# Altium footprint library klp.PcbLib: 436 footprints (part 23 of 28)
Each footprint in its own frame and in the unit in brackets; x right, y up, seen from the top. Pads: shape width x height; smd on the part's side, far side on the other; paste and mask are expansions set on the pad; w line width, h text height; cw(c..) or ccw(c..) is an arc to the next point about the centre after c.
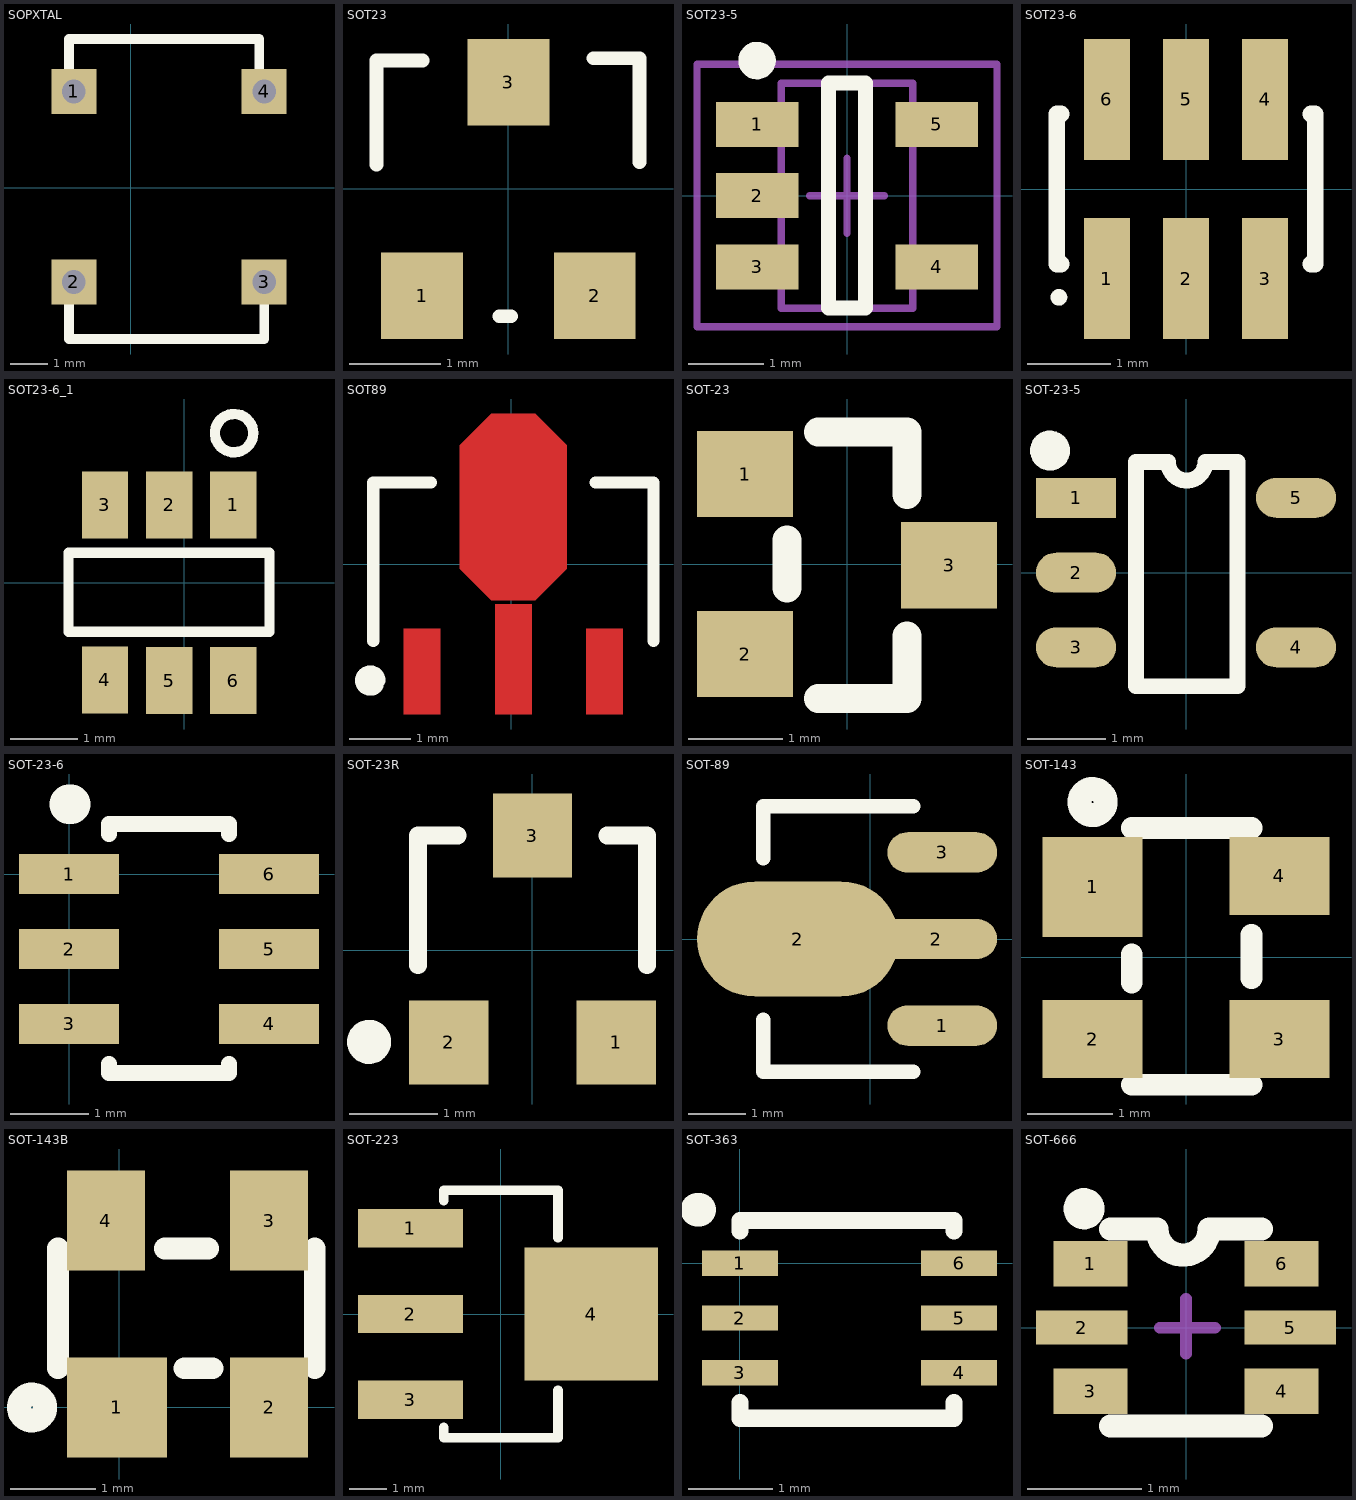
[diagram p22: the footprints below, top view; thin cyan lines are the x and y axes]

## SOPXTAL [mm]
height 1
pads (4):
  rect 1.2x1.2 on Top hole 0.635: 1(-1.524,2.565) 2(-1.524,-2.515) 3(3.556,-2.515) 4(3.556,2.565)
Top Overlay:
  lines w0.254: -1.651,-2.515 -1.651,-4.039 3.556,-4.039 3.556,-2.515 ; -1.651,2.565 -1.651,3.962 3.429,3.962 3.429,2.565

## SOT23 [mm]
pads (3):
  rect 0.9x0.95 smd: 1(-0.95,-1.175) 2(0.95,-1.175) 3(0,1.175)
Top Overlay:
  lines w0.152: -1.453,0.27 -1.453,1.413 -0.945,1.413 ; -0.1,-1.4 0.027,-1.4 ; 0.936,1.439 1.444,1.439 1.444,0.296
3D body "User Library-SOT23-3.STEP": height 1.3, standoff 0, extent -1.45,-1.4 1.45,1.4

## SOT23-5 [mm] "SOT23-5"
pads (5):
  rect 1.1x0.6 smd: 1(-1.2,0.95) 2(-1.2,0) 3(-1.2,-0.95) 4(1.2,-0.95) 5(1.2,0.95)
Top Overlay:
  circle w0.25: c-1.2,1.8 r0.125
  lines w0.2: -0.25,-1.5 0.25,-1.5 0.25,1.5 -0.25,1.5 -0.25,-1.5
Mechanical 13:
  lines w0.1: -0.875,-1.5 -0.875,1.5 0.875,1.5 0.875,-1.5 -0.875,-1.5
Mechanical 15:
  lines w0.1: -0.5,0 0.5,0 ; 0,-0.5 0,0.5 ; -2,-1.75 -2,1.75 2,1.75 2,-1.75 -2,-1.75
3D body "User Library-SOT23-5-2.step": height 1.45, standoff 0, extent -1.4,-1.45 1.4,1.45

## SOT23-6 [mm] "SOT-23/SC-74A; 5 Leads; Body 3.1 x 3 mm, inc. leads (LxW max)"
height 1.45
pads (6):
  rect 0.55x1.45 smd: 1(-0.95,-1.075) 2(0,-1.075) 3(0.95,-1.075) 4(0.95,1.075) 5(0,1.075) 6(-0.95,1.075)
Top Overlay:
  circle w0.1: c-1.525,-1.3 r0.05
  lines w0.2: -1.5,-0.9 -1.55,-0.9 -1.55,0.9 -1.5,0.9 ; 1.5,-0.9 1.55,-0.9 1.55,0.9 1.5,0.9

## SOT23-6_1 [mil]
pads (6):
  rect 27x39 smd: 1(28.63,45.47) 2(-8.78,45.47) 3(-46.18,45.47) 4(-46.18,-56.5) 5(-8.78,-56.89) 6(28.63,-56.89)
Top Overlay:
  circle w6: c29.02,87.2 r11.15
  lines w6: -67.37,-28.53 -67.37,17.47 49.63,17.47 49.63,-28.53 -67.37,-28.53
3D body "User Library-SOT23-6-2.step": height 57.09, standoff 0, extent -65.94,-61.02 48.23,49.21

## SOT89 [mm]
pads (4):
  round 0 smd: 1(-1.463,-1.764) 2(0.038,-1.564) 3(1.538,-1.764) 4(0.038,0.936)
Top Layer:
  region: -0.84,-0.077 -0.326,-0.592 0.401,-0.592 0.915,-0.077 0.915,1.95 0.401,2.464 -0.326,2.464 -0.84,1.95
  region: 1.838,-2.464 1.237,-2.464 1.237,-1.064 1.838,-1.064
  region: 0.338,-2.464 -0.262,-2.464 -0.262,-0.664 0.338,-0.664
  region: -1.162,-2.464 -1.763,-2.464 -1.763,-1.064 -1.162,-1.064
Top Overlay:
  lines w0.2: -2.262,-1.264 -2.262,1.336 -1.312,1.336 ; 1.388,1.336 2.337,1.336 2.337,-1.264
  lines w0.25: -2.218,-1.996 cw(c-2.312,-1.914) -2.188,-1.914
Top Paste:
  region: -0.84,-0.077 -0.326,-0.592 0.401,-0.592 0.915,-0.077 0.915,1.95 0.401,2.464 -0.326,2.464 -0.84,1.95
  region: 1.838,-2.464 1.237,-2.464 1.237,-1.064 1.838,-1.064
  region: 0.338,-2.464 -0.262,-2.464 -0.262,-0.664 0.338,-0.664
  region: -1.162,-2.464 -1.763,-2.464 -1.763,-1.064 -1.162,-1.064
Top Solder:
  region: -0.84,-0.077 -0.326,-0.592 0.401,-0.592 0.915,-0.077 0.915,1.95 0.401,2.464 -0.326,2.464 -0.84,1.95
  region: 1.838,-2.464 1.237,-2.464 1.237,-1.064 1.838,-1.064
  region: 0.338,-2.464 -0.262,-2.464 -0.262,-0.664 0.338,-0.664
  region: -1.162,-2.464 -1.763,-2.464 -1.763,-1.064 -1.162,-1.064

## SOT-23 [mil]
pads (3):
  rect 40x36 smd: 1(-42.5,37.5) 2(-42.5,-37.5) 3(42.5,-0.5)
Top Overlay:
  lines w12: -25,-10 -25,10 ; -12,-56 25,-56 25,-30 ; -12,55 25,55 25,29
3D body "sot23-3.STEP": height 39.37, standoff -0.79, extent -47,-57.48 50.48,57.48

## SOT-23-5 [mil]
pads (5):
  rect 40x20 smd: 1(-55,37.4)
  oval 40x20 smd: 2(-55,0) 3(-55,-37.4) 4(55,-37.4) 5(55,37.4)
Top Overlay:
  circle w10: c-68,61 r5
  lines w7.87: -25,55.4 -25,-56.8 25.7,-56.8 25.7,55.4 ; -9,55.4 ccw(c0.35,55.4) 9.7,55.4
  lines w8: -25,55.4 -9,55.4 ; 9.7,55.4 25.7,55.4
3D body "User Library-SOT23-5.STEP": height 42.79, standoff -0.51, extent -55.16,-57.06 55.09,57.09

## SOT-23-6 [mil]
pads (6):
  rect 50x20 smd: 1(0,0) 2(0,-37.4) 3(0,-74.8) 4(100,-74.8) 5(100,-37.4) 6(100,0)
Top Overlay:
  lines w8: 20,-95 20,-99.32 80,-99.32 80,-95 ; 20,20 20,25 80,25 80,20
  lines w19.68: 0,35 1,35

## SOT-23R [mm]
pads (3):
  rect 0.9x0.95 smd: 1(0.95,-1.048) 2(-0.95,-1.048) 3(0,1.302)
Top Overlay:
  circle w0.25: c-1.856,-1.041 r0.125
  lines w0.2: -1.3,-0.173 -1.3,1.302 -0.85,1.302 ; 0.85,1.302 1.3,1.302 1.3,-0.173

## SOT-89 [mm]
pads (4):
  oval 1.9x0.7 smd: 1(1.25,-1.501) 3(1.25,1.501)
  oval 3.5x2 smd: 2(-1.25,0)
  oval 2.1x0.7 smd: 2(1.151,0)
Top Overlay:
  lines w0.254: -1.85,-1.4 -1.85,-2.3 0.75,-2.3 ; -1.85,1.4 -1.85,2.3 0.75,2.3

## SOT-143 [mil]
pads (4):
  rect 46x46 smd: 1(-43,32.5)
  rect 46x36 smd: 2(-43,-37.5) 3(43,-37.5) 4(43,37.5)
Top Overlay:
  circle w11: c-43,71.5 r6
  lines w10: -25,-58.5 30.12,-58.5 ; -25,-11.5 -25,1.5 ; -25,59.61 30.12,59.61 ; 30.12,-9.5 30.12,10.5

## SOT-143B [mil]
height 47.24
pads (4):
  rect 46x46 smd: 1(-1,0)
  rect 36x46 smd: 2(69,0) 3(69,86) 4(-6,86)
Top Overlay:
  circle w11: c-40,0 r6
  lines w10: -28.11,18 -28.11,73.12 ; 21,73.12 41,73.12 ; 30,18 43,18 ; 90,18 90,73.12

## SOT-223 [mil]
pads (4):
  rect 110x40 smd: 1(-95,90) 2(-95,0) 3(-95,-90)
  rect 140x140 smd: 4(95,0)
Top Overlay:
  lines w10: -60,-119 -60,-130 60,-130 60,-80 ; -60,119 -60,130 60,130 60,80
3D body "SW3DPS-SOT-223-DEFAULT.STEP": height 64.96, standoff -1.18, extent -135.94,-127.92 138.07,127.98

## SOT-363 [mm]
pads (6):
  rect 0.9x0.3 smd: 1(0,0) 2(0,-0.65) 3(0,-1.3) 4(2.6,-1.3) 5(2.6,-0.65) 6(2.6,0)
Top Overlay:
  lines w0.203: 0,-1.651 0,-1.838 2.54,-1.838 2.54,-1.651 ; 0,0.381 0,0.508 2.54,0.508 2.54,0.381
  lines w0.4: -0.508,0.635 -0.483,0.635

## SOT-666 [mm]
pads (6):
  rect 0.65x0.4 smd mask+0.076: 1(-0.838,0.559) 3(-0.838,-0.559) 4(0.838,-0.559) 6(0.838,0.559)
  rect 0.8x0.3 smd mask+0.076: 2(-0.914,0) 5(0.914,0)
Top Overlay:
  circle w0.2: c-0.893,1.041 r0.08
  lines w0.203: -0.66,-0.864 0.66,-0.864 ; -0.66,0.864 -0.254,0.864 ccw(c-0.025,0.864) 0.203,0.864 0.66,0.864
Mechanical 15:
  lines w0.102: -0.229,0 0.254,0 ; 0,-0.229 0,0.254